# Altium footprint library En.PcbLib: 240 footprints (part 3 of 15)
Each footprint in its own frame and in the unit in brackets; x right, y up, seen from the top. Pads: shape width x height; smd on the part's side, far side on the other; paste and mask are expansions set on the pad; w line width, h text height; cw(c..) or ccw(c..) is an arc to the next point about the centre after c.
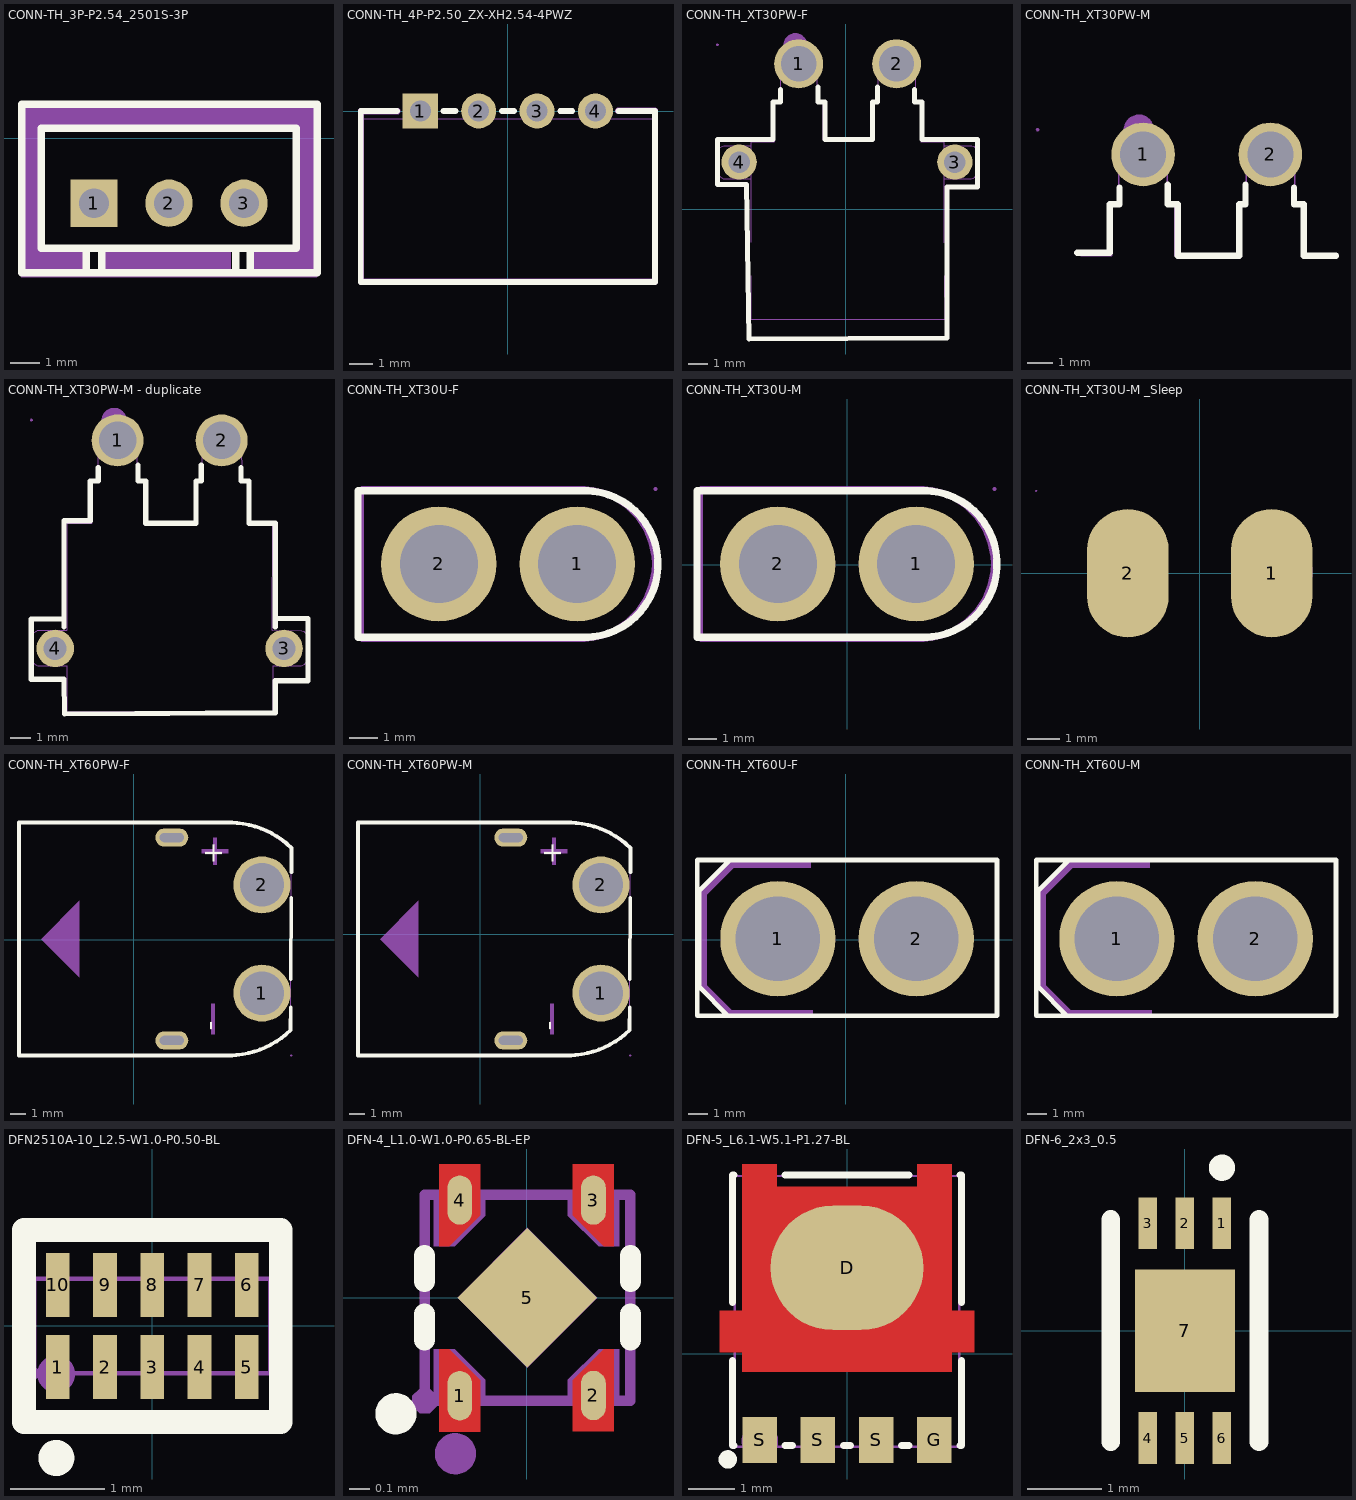
[diagram p2: the footprints below, top view; thin cyan lines are the x and y axes]

## CONN-TH_3P-P2.54_2501S-3P [mm]
pads (3):
  rect 1.6x1.6 hole 1: 1(37.211,-2.199)
  round 1.6 hole 1: 2(39.751,-2.199) 3(42.291,-2.199)
Top Overlay:
  lines w0.254: 36.957,-4.549 36.957,-3.723 ; 37.472,-4.549 37.472,-3.723 ; 42.019,-4.549 42.019,-3.723 ; 42.502,-4.549 42.502,-3.723 ; 34.771,-4.549 44.771,-4.549 44.771,1.151 34.771,1.151 34.771,-4.549 ; 35.433,-3.723 35.433,0.341 44.069,0.341 44.069,-3.723 35.433,-3.723
Mechanical 6:
  region: 42.545,-4.485 42.545,-3.723 44.069,-3.723 44.069,0.341 35.433,0.341 35.433,-3.723 36.957,-3.723 36.957,-4.485 34.671,-4.485 34.671,1.103 44.831,1.103 44.831,-4.485
  region: 37.531,-4.499 41.849,-4.499 41.849,-3.737 37.531,-3.737
Mechanical 15:
  region: 34.811,1.201 34.81,1.225 34.776,1.26 34.727,1.26 34.692,1.225 34.691,1.201 34.692,1.176 34.727,1.142 34.776,1.142 34.81,1.176
  region: 36.886,-1.874 37.536,-1.874 37.536,-2.524 36.886,-2.524
  region: 39.426,-1.874 40.076,-1.874 40.076,-2.524 39.426,-2.524
  region: 41.966,-1.874 42.616,-1.874 42.616,-2.524 41.966,-2.524
  lines w0.051: 34.751,-4.699 44.751,-4.699 44.751,1.201 34.751,1.201 34.751,-4.699
3D body "User Library-XH2_54-3P.sldprt": height 7, standoff -1.8, extent 34.898,-4.813 44.858,0.987

## CONN-TH_4P-P2.50_ZX-XH2.54-4PWZ [mm]
pads (4):
  rect 1.524x1.5 hole 0.9 paste-2539.97 mask+0.05: 1(-3.75,0)
  round 1.5 hole 0.9 paste-2539.97 mask+0.05: 2(-1.25,0) 3(1.25,0) 4(3.75,0)
Top Overlay:
  lines w0.254: -4.743,0 -6.303,0 -6.303,-7.32 6.303,-7.32 ; -2.757,0 -2.243,0 ; -0.257,0 0.257,0 ; 2.243,0 2.757,0 ; 4.743,0 6.303,0 6.303,-7.239
Mechanical 6:
  region: -4.735,-0.127 -6.168,-0.127 -6.168,-7.188 6.178,-7.188 6.178,-0.122 4.735,-0.122 4.682,-0.122 4.608,-0.048 4.608,0.058 4.682,0.132 4.735,0.132 6.305,0.132 6.33,0.132 6.377,0.113 6.413,0.077 6.432,0.03 6.432,0.005 6.432,-7.315 6.432,-7.34 6.413,-7.387 6.377,-7.423 6.33,-7.442 6.305,-7.442 -6.295,-7.442 -6.32,-7.442 -6.367,-7.423 -6.403,-7.387 -6.422,-7.34 -6.422,-7.315 -6.422,0 -6.422,0.025 -6.403,0.072 -6.367,0.108 -6.32,0.127 -6.295,0.127 -4.735,0.127 -4.682,0.127 -4.608,0.053 -4.608,-0.053 -4.682,-0.127
Mechanical 15:
  region: -4.07,-0.32 -4.07,-0.31 -3.435,-0.31 -3.43,-0.305 -3.43,-0.33 -4.07,-0.33
  region: -1.57,-0.32 -1.57,-0.31 -0.935,-0.31 -0.93,-0.305 -0.93,-0.33 -1.57,-0.33
  region: 0.93,-0.32 0.93,-0.31 1.565,-0.31 1.57,-0.305 1.57,-0.33 0.93,-0.33
  region: 3.43,-0.32 3.43,-0.31 4.065,-0.31 4.07,-0.305 4.07,-0.33 3.43,-0.33
  region: 3.43,0.32 4.07,0.32 4.07,-0.32 3.43,-0.32
  region: 0.93,0.32 1.57,0.32 1.57,-0.32 0.93,-0.32
  region: -1.57,0.32 -0.93,0.32 -0.93,-0.32 -1.57,-0.32
  region: -4.07,0.32 -3.43,0.32 -3.43,-0.32 -4.07,-0.32
  region: -6.19,-7.32 -6.191,-7.296 -6.226,-7.262 -6.274,-7.262 -6.309,-7.296 -6.31,-7.32 -6.309,-7.344 -6.274,-7.378 -6.226,-7.378 -6.191,-7.344
  lines w0.051: -6.25,-7.32 6.25,-7.32 6.25,-0.32 -6.25,-0.32 -6.25,-7.32
3D body "zx-xh2.54-4pwz.step": height 5.92, standoff -3.38, extent -6.25,-7.249 6.26,0.391

## CONN-TH_XT30PW-F [mm]
pads (4):
  round 2.5 hole 1.8: 1(-2.394,7.435) 2(2.606,7.435)
  round 1.8 hole 1.1: 3(5.588,2.413) 4(-5.436,2.413)
Top Overlay:
  lines w0.254: -3.323,6.118 -3.323,5.483 -3.704,5.483 -3.704,3.556 -4.974,3.556 -6.544,3.556 -6.544,1.27 -5.071,1.27 -4.927,-6.629 5.186,-6.571 5.186,1.143 6.756,1.143 6.756,3.556 5.186,3.556 3.916,3.556 3.916,5.483 3.535,5.483 3.535,6.118 ; -1.418,6.245 -1.418,5.483 -1.037,5.483 -1.037,3.556 1.376,3.556 1.376,5.483 1.63,5.483 1.63,6.245
Mechanical 6:
  circle w0.6: c-2.561,8.404 r0.3
Mechanical 15:
  drawing of 94 lines, arcs and shapes, not listed
3D body "User Library-XT30PW-F.sldprt": height 5, standoff -2, extent -6.523,-6.499 6.777,8.401

## CONN-TH_XT30PW-M [mm]
pads (2):
  round 2.5 hole 1.8: 1(42.945,-26.347) 2(47.945,-26.347)
Top Overlay:
  lines w0.254: 40.365,-30.204 41.635,-30.204 41.635,-28.299 42.016,-28.299 42.016,-27.664 ; 43.921,-27.537 43.921,-28.299 44.302,-28.299 44.302,-30.331 46.715,-30.331 46.715,-28.299 46.969,-28.299 46.969,-27.537 ; 48.874,-27.664 48.874,-28.299 49.255,-28.299 49.255,-30.331 50.525,-30.331
Mechanical 6:
  circle w0.6: c42.778,-25.378 r0.3
Mechanical 15:
  region: 48.595,-26.347 48.595,-26.262 48.551,-26.096 48.465,-25.948 48.344,-25.827 48.196,-25.742 48.031,-25.697 47.859,-25.697 47.694,-25.742 47.546,-25.827 47.425,-25.948 47.339,-26.096 47.295,-26.262 47.295,-26.347 47.295,-26.433 47.339,-26.598 47.425,-26.747 47.546,-26.868 47.694,-26.953 47.859,-26.998 48.031,-26.998 48.196,-26.953 48.344,-26.868 48.465,-26.747 48.551,-26.598 48.595,-26.433
  region: 43.595,-26.347 43.595,-26.262 43.551,-26.096 43.465,-25.948 43.344,-25.827 43.196,-25.742 43.031,-25.697 42.859,-25.697 42.694,-25.742 42.546,-25.827 42.425,-25.948 42.339,-26.096 42.295,-26.262 42.295,-26.347 42.295,-26.433 42.339,-26.598 42.425,-26.747 42.546,-26.868 42.694,-26.953 42.859,-26.998 43.031,-26.998 43.196,-26.953 43.344,-26.868 43.465,-26.747 43.551,-26.598 43.595,-26.433
  region: 38.855,-25.376 38.855,-25.351 38.82,-25.316 38.77,-25.316 38.735,-25.351 38.735,-25.376 38.735,-25.401 38.77,-25.436 38.82,-25.436 38.855,-25.401
  lines w0.051: 40.49,-30.323 41.704,-30.327 41.697,-28.328 41.994,-28.33 41.994,-26.255 42.025,-26.095 42.073,-25.95 42.094,-25.912 42.094,-25.911 42.14,-25.804 42.258,-25.682 42.361,-25.574 42.498,-25.489 42.635,-25.428 42.78,-25.384 42.956,-25.377 43.097,-25.388 43.25,-25.428 43.398,-25.491 43.531,-25.579 43.642,-25.687 43.75,-25.813 43.818,-25.956 43.865,-26.101 43.897,-26.25 43.895,-28.328 44.196,-28.328 44.195,-30.33 46.701,-30.327 46.696,-28.329 46.998,-28.325 46.993,-26.256 47.025,-26.093 47.076,-25.942 47.147,-25.804 47.244,-25.688 47.366,-25.576 47.497,-25.488 47.627,-25.429 47.783,-25.387 47.934,-25.376 48.105,-25.386 48.26,-25.431 48.392,-25.486 48.522,-25.578 48.651,-25.691 48.745,-25.807 48.812,-25.944 48.864,-26.09 48.897,-26.243 48.904,-28.325 49.185,-28.329 49.197,-30.33 50.395,-30.325

## CONN-TH_XT30PW-M - duplicate [mm]
pads (4):
  round 2.5 hole 1.8: 1(42.945,-26.347) 2(47.945,-26.347)
  round 1.8 hole 1.1: 3(50.945,-36.347) 4(39.945,-36.347)
Top Overlay:
  lines w0.254: 40.365,-35.297 40.365,-31.3 40.365,-30.204 41.635,-30.204 41.635,-28.299 42.016,-28.299 42.016,-27.664 ; 40.365,-34.932 38.795,-34.932 38.795,-37.828 40.365,-37.828 40.395,-39.497 50.525,-39.439 50.525,-37.897 ; 43.921,-27.537 43.921,-28.299 44.302,-28.299 44.302,-30.331 46.715,-30.331 46.715,-28.299 46.969,-28.299 46.969,-27.537 ; 48.874,-27.664 48.874,-28.299 49.255,-28.299 49.255,-30.331 50.525,-30.331 50.525,-31.3 50.525,-35.297 ; 50.525,-37.898 52.095,-37.898 52.095,-34.907 50.525,-34.907
Mechanical 6:
  circle w0.6: c42.778,-25.378 r0.3
Mechanical 15:
  drawing of 94 lines, arcs and shapes, not listed
3D body "User Library-XT30PW-M.sldprt": height 5, standoff -2, extent 38.77,-39.483 52.07,-25.541

## CONN-TH_XT30U-F [mm]
pads (2):
  round 4 hole 2.7: 1(44.818,-8.984) 2(40.018,-8.984)
Top Overlay:
  lines w0.254: 45.085,-11.524 ccw(c45.085,-8.984) 45.085,-6.444 ; 45.212,-11.524 37.211,-11.524 37.211,-6.444 45.212,-6.444
Mechanical 6:
  region: 47.418,-8.984 47.406,-8.739 47.31,-8.258 47.123,-7.805 46.85,-7.398 46.504,-7.051 46.096,-6.779 45.644,-6.592 45.163,-6.496 44.918,-6.484 44.918,-6.284 45.095,-6.284 45.446,-6.33 45.788,-6.422 46.115,-6.557 46.421,-6.734 46.702,-6.95 46.952,-7.2 47.168,-7.481 47.345,-7.787 47.48,-8.114 47.572,-8.456 47.618,-8.807 47.618,-8.984
  region: 44.918,-11.484 45.163,-11.472 45.644,-11.376 46.096,-11.189 46.504,-10.917 46.85,-10.57 47.123,-10.162 47.31,-9.71 47.406,-9.229 47.418,-8.984 47.618,-8.984 47.618,-9.161 47.572,-9.512 47.48,-9.854 47.345,-10.181 47.168,-10.487 46.952,-10.768 46.702,-11.018 46.421,-11.234 46.115,-11.411 45.788,-11.546 45.446,-11.638 45.095,-11.684 44.918,-11.684
  region: 44.918,-6.284 37.318,-6.284 37.218,-6.384 37.218,-11.584 37.318,-11.684 44.918,-11.684 44.918,-11.484 37.418,-11.484 37.418,-6.484 44.918,-6.484
Mechanical 15:
  region: 45.918,-8.984 45.918,-8.852 45.85,-8.598 45.718,-8.37 45.532,-8.184 45.304,-8.052 45.05,-7.984 44.786,-7.984 44.532,-8.052 44.304,-8.184 44.118,-8.37 43.986,-8.598 43.918,-8.852 43.918,-8.984 43.918,-9.116 43.986,-9.37 44.118,-9.598 44.304,-9.784 44.532,-9.916 44.786,-9.984 45.05,-9.984 45.304,-9.916 45.532,-9.784 45.718,-9.598 45.85,-9.37 45.918,-9.116
  region: 40.918,-8.984 40.918,-8.852 40.85,-8.598 40.718,-8.37 40.532,-8.184 40.304,-8.052 40.05,-7.984 39.786,-7.984 39.532,-8.052 39.304,-8.184 39.118,-8.37 38.986,-8.598 38.918,-8.852 38.918,-8.984 38.918,-9.116 38.986,-9.37 39.118,-9.598 39.304,-9.784 39.532,-9.916 39.786,-9.984 40.05,-9.984 40.304,-9.916 40.532,-9.784 40.718,-9.598 40.85,-9.37 40.918,-9.116
  region: 47.592,-6.384 47.592,-6.359 47.557,-6.324 47.507,-6.324 47.472,-6.359 47.472,-6.384 47.472,-6.409 47.507,-6.444 47.557,-6.444 47.592,-6.409
  lines w0.051: 37.318,-11.584 44.932,-11.584 ccw(c44.932,-8.984) 47.532,-8.984 ccw(c44.932,-8.984) 44.932,-6.384 37.338,-6.444 ccw(c37.338,-6.464) 37.318,-6.464 37.318,-11.584
3D body "User Library-xt30-f.sldprt": height 9.4, standoff -3, extent 37.191,-11.55 47.391,-6.35

## CONN-TH_XT30U-M [mm]
pads (2):
  round 4 hole 2.7: 1(2.4,0.033) 2(-2.4,0.033)
Top Overlay:
  lines w0.254: 2.667,-2.507 ccw(c2.667,0.033) 2.667,2.573 ; 2.794,-2.507 -5.207,-2.507 -5.207,2.573 2.794,2.573
Mechanical 6:
  region: 2.5,2.733 -5.1,2.733 -5.2,2.633 -5.2,-2.567 -5.1,-2.667 2.5,-2.667 2.5,-2.467 -5,-2.467 -5,2.533 2.5,2.533
  region: 2.5,-2.467 2.745,-2.455 3.226,-2.359 3.678,-2.172 4.086,-1.9 4.432,-1.553 4.705,-1.145 4.892,-0.693 4.988,-0.212 5,0.033 5.2,0.033 5.2,-0.144 5.154,-0.495 5.062,-0.837 4.927,-1.164 4.75,-1.47 4.534,-1.751 4.284,-2.001 4.003,-2.217 3.697,-2.394 3.37,-2.529 3.028,-2.621 2.677,-2.667 2.5,-2.667
  region: 5,0.033 4.988,0.278 4.892,0.759 4.705,1.212 4.432,1.619 4.086,1.966 3.678,2.238 3.226,2.425 2.745,2.521 2.5,2.533 2.5,2.733 2.677,2.733 3.028,2.687 3.37,2.595 3.697,2.46 4.003,2.283 4.284,2.067 4.534,1.817 4.75,1.536 4.927,1.23 5.062,0.903 5.154,0.561 5.2,0.21 5.2,0.033
Mechanical 15:
  region: 5.174,2.633 5.174,2.658 5.139,2.693 5.089,2.693 5.054,2.658 5.054,2.633 5.054,2.608 5.089,2.573 5.139,2.573 5.174,2.608
  region: -1.5,0.033 -1.5,0.165 -1.568,0.419 -1.7,0.647 -1.886,0.833 -2.114,0.965 -2.368,1.033 -2.632,1.033 -2.886,0.965 -3.114,0.833 -3.3,0.647 -3.432,0.419 -3.5,0.165 -3.5,0.033 -3.5,-0.099 -3.432,-0.353 -3.3,-0.581 -3.114,-0.767 -2.886,-0.899 -2.632,-0.967 -2.368,-0.967 -2.114,-0.899 -1.886,-0.767 -1.7,-0.581 -1.568,-0.353 -1.5,-0.099
  region: 3.5,0.033 3.5,0.165 3.432,0.419 3.3,0.647 3.114,0.833 2.886,0.965 2.632,1.033 2.368,1.033 2.114,0.965 1.886,0.833 1.7,0.647 1.568,0.419 1.5,0.165 1.5,0.033 1.5,-0.099 1.568,-0.353 1.7,-0.581 1.886,-0.767 2.114,-0.899 2.368,-0.967 2.632,-0.967 2.886,-0.899 3.114,-0.767 3.3,-0.581 3.432,-0.353 3.5,-0.099
  lines w0.051: -5.1,-2.567 -5.1,2.553 cw(c-5.08,2.553) -5.08,2.573 2.514,2.633 cw(c2.514,0.033) 5.114,0.033 cw(c2.514,0.033) 2.514,-2.567 -5.1,-2.567
3D body "User Library-xt30upb-m_XT30UPB-M-PIN.sldprt": height 7.81, standoff -2.59, extent 1.176,-1.217 3.676,1.283
3D body "User Library-xt30upb-m_XT30UPB-M-PIN.sldprt": height 7.81, standoff -2.59, extent -3.65,-1.217 -1.15,1.283
3D body "User Library-xt30upb-m_XT30UPB-M.sldprt": height 9.41, standoff 0.01, extent -5.12,-2.473 5.08,2.727

## CONN-TH_XT30U-M _Sleep [mm]
pads (2):
  oval 2.54x4 smd: 1(2.241,0) 2(-2.241,0)
Mechanical 15:
  region: 3.5,0.033 3.5,0.165 3.432,0.419 3.3,0.647 3.114,0.833 2.886,0.965 2.632,1.033 2.368,1.033 2.114,0.965 1.886,0.833 1.7,0.647 1.568,0.419 1.5,0.165 1.5,0.033 1.5,-0.099 1.568,-0.353 1.7,-0.581 1.886,-0.767 2.114,-0.899 2.368,-0.967 2.632,-0.967 2.886,-0.899 3.114,-0.767 3.3,-0.581 3.432,-0.353 3.5,-0.099
  region: -1.5,0.033 -1.5,0.165 -1.568,0.419 -1.7,0.647 -1.886,0.833 -2.114,0.965 -2.368,1.033 -2.632,1.033 -2.886,0.965 -3.114,0.833 -3.3,0.647 -3.432,0.419 -3.5,0.165 -3.5,0.033 -3.5,-0.099 -3.432,-0.353 -3.3,-0.581 -3.114,-0.767 -2.886,-0.899 -2.632,-0.967 -2.368,-0.967 -2.114,-0.899 -1.886,-0.767 -1.7,-0.581 -1.568,-0.353 -1.5,-0.099
  lines w0.051: -5.1,2.553 cw(c-5.08,2.553) -5.08,2.573
3D body "xt30u-m.step": height 3.85, standoff -1.36, extent -5.1,-13.494 5.1,0.206

## CONN-TH_XT60PW-F [mm]
pads (4):
  round 3.8 hole 2.9 paste-2539.97 mask+0.05: 1(8.545,-3.54) 2(8.545,3.66)
  oval 2.2x1.2 hole 0.6 slot 1.6 at 0 deg paste-2539.97 mask+0.05: ""(2.546,-6.69) ""(2.546,6.81)
Top Overlay:
  lines w0.254: 6.434,-7.687 ccw(c6.292,-1.689) 10.462,-6.002 ; 6.482,7.807 cw(c6.34,1.809) 10.51,6.122 10.502,4.501 ; 6.545,-7.69 -7.62,-7.69 -7.62,7.81 6.545,7.81 ; 10.447,-5.934 10.455,-4.484 ; 10.465,-2.616 10.493,2.798
  text "-" at 5.655,-6.036 h1.33
  text "+" at 5.909,5.013 h1.33
Mechanical 6:
  region: -3.599,2.6 -3.599,-2.48 -6.139,0.06
  region: 5.292,6.791 5.546,6.791 5.546,6.029 6.308,6.029 6.308,5.775 5.546,5.775 5.546,5.013 5.292,5.013 5.292,5.775 4.53,5.775 4.53,6.029 5.292,6.029
  region: 5.165,-4.258 5.419,-4.258 5.419,-6.29 5.165,-6.29
Mechanical 15:
  region: 10.558,-7.687 10.557,-7.663 10.523,-7.63 10.474,-7.63 10.44,-7.663 10.439,-7.687 10.44,-7.711 10.474,-7.745 10.523,-7.745 10.557,-7.711
  region: 3.146,-6.49 3.146,-6.89 1.946,-6.89 1.946,-6.49
  region: 9.546,-3.54 9.546,-3.408 9.477,-3.154 9.346,-2.926 9.16,-2.74 8.932,-2.608 8.677,-2.54 8.414,-2.54 8.159,-2.608 7.931,-2.74 7.745,-2.926 7.613,-3.154 7.545,-3.408 7.545,-3.54 7.545,-3.672 7.613,-3.926 7.745,-4.154 7.931,-4.34 8.159,-4.472 8.414,-4.54 8.677,-4.54 8.932,-4.472 9.16,-4.34 9.346,-4.154 9.477,-3.926 9.546,-3.672
  region: 9.546,3.66 9.546,3.792 9.477,4.046 9.346,4.274 9.16,4.46 8.932,4.592 8.677,4.66 8.414,4.66 8.159,4.592 7.931,4.46 7.745,4.274 7.613,4.046 7.545,3.792 7.545,3.66 7.545,3.528 7.613,3.274 7.745,3.046 7.931,2.86 8.159,2.728 8.414,2.66 8.677,2.66 8.932,2.728 9.16,2.86 9.346,3.046 9.477,3.274 9.546,3.528
  region: 3.146,7.01 3.146,6.61 1.946,6.61 1.946,7.01
  lines w0.051: -7.62,-7.687 6.688,-7.687 7.704,-7.433 8.72,-7.179 9.482,-6.798 10.244,-6.163 10.447,-5.934 10.498,6.029 10.371,6.156 9.355,6.918 8.339,7.426 7.323,7.68 6.561,7.807 -7.62,7.807 -7.62,-7.687
3D body "User Library-XT60PW-F.sldprt": height 8.4, standoff -2.5, extent -6.822,-7.69 10.378,7.81

## CONN-TH_XT60PW-M [mm]
pads (4):
  round 3.8 hole 2.9 paste-2539.97 mask+0.05: 1(8.037,-3.921) 2(8.037,3.279)
  oval 2.2x1.2 hole 0.6 slot 1.6 at 0 deg paste-2539.97 mask+0.05: ""(2.038,-7.071) ""(2.038,6.429)
Top Overlay:
  lines w0.254: 5.926,-8.068 ccw(c5.784,-2.07) 9.954,-6.383 ; 5.974,7.426 cw(c5.832,1.428) 10.002,5.741 9.994,4.12 ; 6.037,-8.071 -8.128,-8.071 -8.128,7.429 6.037,7.429 ; 9.939,-6.315 9.947,-4.865 ; 9.957,-2.997 9.985,2.417
  text "-" at 5.147,-6.417 h1.33
  text "+" at 5.401,4.632 h1.33
Mechanical 6:
  region: -4.107,2.219 -4.107,-2.861 -6.647,-0.321
  region: 4.784,6.41 5.038,6.41 5.038,5.648 5.8,5.648 5.8,5.394 5.038,5.394 5.038,4.632 4.784,4.632 4.784,5.394 4.022,5.394 4.022,5.648 4.784,5.648
  region: 4.657,-4.639 4.911,-4.639 4.911,-6.671 4.657,-6.671
Mechanical 15:
  region: 10.05,-8.068 10.049,-8.044 10.015,-8.011 9.966,-8.011 9.932,-8.044 9.931,-8.068 9.932,-8.092 9.966,-8.126 10.015,-8.126 10.049,-8.092
  region: 9.038,3.279 9.038,3.411 8.969,3.665 8.838,3.893 8.652,4.079 8.424,4.211 8.169,4.279 7.906,4.279 7.651,4.211 7.423,4.079 7.237,3.893 7.105,3.665 7.037,3.411 7.037,3.279 7.037,3.147 7.105,2.893 7.237,2.665 7.423,2.479 7.651,2.347 7.906,2.279 8.169,2.279 8.424,2.347 8.652,2.479 8.838,2.665 8.969,2.893 9.038,3.147
  region: 9.038,-3.921 9.038,-3.789 8.969,-3.535 8.838,-3.307 8.652,-3.121 8.424,-2.989 8.169,-2.921 7.906,-2.921 7.651,-2.989 7.423,-3.121 7.237,-3.307 7.105,-3.535 7.037,-3.789 7.037,-3.921 7.037,-4.053 7.105,-4.307 7.237,-4.535 7.423,-4.721 7.651,-4.853 7.906,-4.921 8.169,-4.921 8.424,-4.853 8.652,-4.721 8.838,-4.535 8.969,-4.307 9.038,-4.053
  region: 2.638,6.629 2.638,6.229 1.438,6.229 1.438,6.629
  region: 2.638,-6.871 2.638,-7.271 1.438,-7.271 1.438,-6.871
  lines w0.051: -8.128,-8.068 6.18,-8.068 7.196,-7.814 8.212,-7.56 8.974,-7.179 9.736,-6.544 9.939,-6.315 9.99,5.648 9.863,5.775 8.847,6.537 7.831,7.045 6.815,7.299 6.053,7.426 -8.128,7.426 -8.128,-8.068
3D body "xt60pw-m.step": height 8.13, standoff -2.97, extent -8.112,-8.071 9.988,7.429

## CONN-TH_XT60U-F [mm]
pads (2):
  round 6 hole 4.4 paste-2539.97 mask+0.05: 1(-3.537,0.046) 2(3.663,0.046)
Top Overlay:
  lines w0.254: -5.936,-3.954 -7.737,-3.954 -7.737,4.146 -6.038,4.146 ; -5.238,4.146 7.863,4.146 7.863,-3.955 -6.137,-3.955 -7.636,-2.453 -7.636,2.545 -6.038,4.146 ; -5.136,4.146 -6.038,4.146
Mechanical 6:
  region: -1.837,4.146 -6.037,4.146 -7.637,2.546 -7.637,-2.454 -6.137,-3.954 -1.737,-3.954 -1.737,-3.654 -5.937,-3.654 -7.237,-2.354 -7.237,2.346 -5.837,3.746 -1.837,3.746
Mechanical 15:
  region: 5.413,0.046 5.413,0.218 5.346,0.556 5.214,0.875 5.022,1.162 4.779,1.405 4.492,1.597 4.173,1.729 3.835,1.796 3.491,1.796 3.152,1.729 2.834,1.597 2.547,1.405 2.304,1.162 2.112,0.875 1.98,0.556 1.913,0.218 1.913,0.046 1.913,-0.126 1.98,-0.464 2.112,-0.783 2.304,-1.07 2.547,-1.313 2.834,-1.505 3.152,-1.637 3.491,-1.704 3.835,-1.704 4.173,-1.637 4.492,-1.505 4.779,-1.313 5.022,-1.07 5.214,-0.783 5.346,-0.464 5.413,-0.126
  region: -1.787,0.046 -1.787,0.218 -1.854,0.556 -1.986,0.875 -2.178,1.162 -2.421,1.405 -2.708,1.597 -3.026,1.729 -3.365,1.796 -3.709,1.796 -4.047,1.729 -4.366,1.597 -4.653,1.405 -4.896,1.162 -5.088,0.875 -5.22,0.556 -5.287,0.218 -5.287,0.046 -5.287,-0.126 -5.22,-0.464 -5.088,-0.783 -4.896,-1.07 -4.653,-1.313 -4.366,-1.505 -4.047,-1.637 -3.709,-1.704 -3.365,-1.704 -3.026,-1.637 -2.708,-1.505 -2.421,-1.313 -2.178,-1.07 -1.986,-0.783 -1.854,-0.464 -1.787,-0.126
  region: -7.627,-4.004 -7.627,-3.979 -7.662,-3.944 -7.712,-3.944 -7.747,-3.979 -7.747,-4.004 -7.747,-4.029 -7.712,-4.064 -7.662,-4.064 -7.627,-4.029
  lines w0.051: -7.687,-4.004 7.813,-4.004 7.813,4.096 -7.687,4.096 -7.687,-4.004
3D body "User Library-XT60.sldprt": height 5.38, standoff -16.62, extent -7.967,-3.937 7.967,4.191

## CONN-TH_XT60U-M [mm]
pads (2):
  round 6 hole 4.4 paste-2539.97 mask+0.05: 1(39.897,-29.037) 2(47.097,-29.037)
Top Overlay:
  lines w0.254: 37.498,-33.037 35.697,-33.037 35.697,-24.937 37.396,-24.937 ; 38.196,-24.937 51.297,-24.937 51.297,-33.038 37.297,-33.038 35.798,-31.536 35.798,-26.538 37.396,-24.937 ; 38.298,-24.937 37.396,-24.937
Mechanical 6:
  region: 41.597,-24.937 37.397,-24.937 35.797,-26.537 35.797,-31.537 37.297,-33.037 41.697,-33.037 41.697,-32.737 37.497,-32.737 36.197,-31.437 36.197,-26.737 37.597,-25.337 41.597,-25.337
Mechanical 15:
  region: 35.807,-33.087 35.807,-33.062 35.772,-33.027 35.722,-33.027 35.687,-33.062 35.687,-33.087 35.687,-33.112 35.722,-33.147 35.772,-33.147 35.807,-33.112
  region: 41.647,-29.037 41.647,-28.865 41.58,-28.527 41.448,-28.208 41.256,-27.921 41.013,-27.678 40.726,-27.486 40.408,-27.354 40.069,-27.287 39.725,-27.287 39.387,-27.354 39.068,-27.486 38.781,-27.678 38.538,-27.921 38.346,-28.208 38.214,-28.527 38.147,-28.865 38.147,-29.037 38.147,-29.209 38.214,-29.547 38.346,-29.866 38.538,-30.153 38.781,-30.396 39.068,-30.588 39.387,-30.72 39.725,-30.787 40.069,-30.787 40.408,-30.72 40.726,-30.588 41.013,-30.396 41.256,-30.153 41.448,-29.866 41.58,-29.547 41.647,-29.209
  region: 48.847,-29.037 48.847,-28.865 48.78,-28.527 48.648,-28.208 48.456,-27.921 48.213,-27.678 47.926,-27.486 47.607,-27.354 47.269,-27.287 46.925,-27.287 46.586,-27.354 46.268,-27.486 45.981,-27.678 45.738,-27.921 45.546,-28.208 45.414,-28.527 45.347,-28.865 45.347,-29.037 45.347,-29.209 45.414,-29.547 45.546,-29.866 45.738,-30.153 45.981,-30.396 46.268,-30.588 46.586,-30.72 46.925,-30.787 47.269,-30.787 47.607,-30.72 47.926,-30.588 48.213,-30.396 48.456,-30.153 48.648,-29.866 48.78,-29.547 48.847,-29.209
  lines w0.051: 35.747,-33.087 35.747,-24.987 51.247,-24.987 51.247,-33.087 35.747,-33.087
3D body "User Library-XT60UPB Fem Vert_60UPB-MTJ.sldprt": height 8.38, standoff -6.02, extent 37.747,-31.187 42.047,-26.887
3D body "User Library-XT60UPB Fem Vert_60UPB-MTJ.sldprt": height 8.38, standoff -6.02, extent 44.986,-31.187 49.286,-26.887
3D body "User Library-XT60UPB Fem Vert_XT60UPB-ME毈_-UL.sldprt": height 13.5, standoff 0, extent 35.89,-33.02 51.232,-25.12

## DFN2510A-10_L2.5-W1.0-P0.50-BL [mm]
pads (10):
  rect 0.25x0.68 smd: 1(-1,-0.435) 2(-0.5,-0.435) 3(0,-0.435) 4(0.5,-0.435) 5(1,-0.435) 6(1,0.435) 7(0.5,0.435) 8(0,0.435) 9(-0.5,0.435) 10(-1,0.435)
Top Overlay:
  circle w0.254: c-1.016,-1.397 r0.064
  lines w0.254: -1.36,-1.016 1.36,-1.016 1.36,1.016 -1.36,1.016 -1.36,-1.016
Mechanical 6:
  circle w0.2: c-1.016,-0.508 r0.1
Mechanical 15:
  region: -1.19,-0.5 -1.191,-0.476 -1.226,-0.442 -1.274,-0.442 -1.309,-0.476 -1.31,-0.5 -1.309,-0.525 -1.274,-0.559 -1.226,-0.559 -1.191,-0.525
  region: -1.1,-0.1 -0.9,-0.1 -0.9,-0.5 -1.1,-0.5
  region: -0.6,-0.1 -0.4,-0.1 -0.4,-0.5 -0.6,-0.5
  region: -0.1,-0.1 0.1,-0.1 0.1,-0.5 -0.1,-0.5
  region: 0.4,-0.1 0.6,-0.1 0.6,-0.5 0.4,-0.5
  region: 0.9,-0.1 1.1,-0.1 1.1,-0.5 0.9,-0.5
  region: 0.9,0.5 1.1,0.5 1.1,0.1 0.9,0.1
  region: 0.4,0.5 0.6,0.5 0.6,0.1 0.4,0.1
  region: -0.1,0.5 0.1,0.5 0.1,0.1 -0.1,0.1
  region: -0.6,0.5 -0.4,0.5 -0.4,0.1 -0.6,0.1
  region: -1.1,0.5 -0.9,0.5 -0.9,0.1 -1.1,0.1
  lines w0.051: -1.25,-0.5 -1.25,0.5 1.25,0.5 1.25,-0.5 -1.25,-0.5
3D body "ip4292cz10-tbr.115.step": height 0.49, standoff -0.02, extent -1.26,-0.56 1.26,0.56

## DFN-4_L1.0-W1.0-P0.65-BL-EP [mm]
pads (5):
  oval 0.12x0.24 smd: 1(-0.325,-0.475) 2(0.325,-0.474) 3(0.325,0.475) 4(-0.325,0.475)
  rect 0.48x0.48 smd rot 45: 5(0.004,0.001)
Top Layer:
  region: 0.425,-0.649 0.225,-0.649 0.225,-0.399 0.375,-0.249 0.425,-0.249
  region: -0.225,-0.4 -0.225,-0.65 -0.425,-0.65 -0.425,-0.25 -0.375,-0.25
  region: -0.425,0.651 -0.225,0.651 -0.225,0.401 -0.375,0.251 -0.425,0.251
  region: 0.425,0.651 0.425,0.251 0.375,0.251 0.225,0.401 0.225,0.651
Top Overlay:
  circle w0.1: c-0.635,-0.563 r0.05
  lines w0.102: -0.496,-0.205 -0.496,-0.078 ; -0.496,0.079 -0.496,0.206 ; 0.504,-0.205 0.504,-0.078 ; 0.504,0.079 0.504,0.206
Mechanical 6:
  circle w0.1: c-0.346,-0.757 r0.05
Mechanical 15:
  region: -0.435,-0.501 -0.436,-0.477 -0.471,-0.442 -0.52,-0.442 -0.555,-0.477 -0.555,-0.501 -0.555,-0.526 -0.52,-0.56 -0.471,-0.56 -0.436,-0.526
  region: 0.45,-0.499 0.2,-0.499 0.2,-0.399 0.35,-0.249 0.45,-0.249
  region: -0.45,-0.499 -0.2,-0.499 -0.2,-0.399 -0.35,-0.249 -0.45,-0.249
  region: 0.45,0.501 0.2,0.501 0.2,0.4 0.35,0.25 0.45,0.25
  region: -0.45,0.501 -0.2,0.501 -0.2,0.4 -0.35,0.25 -0.45,0.25
  region: -0.335,0.001 0.004,0.34 0.344,0.001 0.004,-0.339
  lines w0.051: -0.495,-0.499 0.505,-0.499 0.505,0.501 -0.495,0.501 -0.495,-0.499
3D body "sk6018cd4-33.step": height 0.51, standoff 0, extent -0.51,-0.51 0.51,0.51

## DFN-5_L6.1-W5.1-P1.27-BL [mm]
pads (5):
  oval 3.33x2.718 smd: D(0,1.875)
  rect 0.75x1 smd: G(1.905,-1.875) S(-1.905,-1.875) S(-0.635,-1.875) S(0.635,-1.875)
Top Layer:
  region: -2.28,-0.39 -2.28,0.035 -2.775,0.035 -2.775,0.94 -2.28,0.94 -2.28,4.14 -1.53,4.14 -1.53,3.64 1.53,3.64 1.53,4.14 2.28,4.14 2.28,0.94 2.775,0.94 2.775,0.035 2.28,0.035 2.28,-0.39
Top Overlay:
  circle w0.2: c-2.6,-2.3 r0.1
  lines w0.152: -2.5,-0.145 -2.5,-2 -2.46,-2 ; -2.5,1.12 -2.5,3.9 -2.46,3.9 ; -1.35,-2 -1.19,-2 ; -1.35,3.9 1.35,3.9 ; -0.08,-2 0.08,-2 ; 1.19,-2 1.35,-2 ; 2.46,-2 2.5,-2 2.5,-0.145 ; 2.46,3.9 2.5,3.9 2.5,1.12
Mechanical 6:
  circle w0.4: c-1.9,-1.9 r0.2
Mechanical 15:
  region: -1.7,3.977 -1.7,3.402 1.7,3.402 1.7,3.977 2.11,3.977 2.11,3.127 2,3.127 2,1.552 2,0.632 2.575,0.632 2.575,0.222 2,0.222 2,-0.248 -2,-0.248 -2,0.222 -2.575,0.222 -2.575,0.632 -2,0.632 -2,3.127 -2.11,3.127 -2.11,3.977
  region: 1.7,-1.598 2.11,-1.598 2.11,-2.173 1.7,-2.173
  region: 0.43,-1.598 0.84,-1.598 0.84,-2.173 0.43,-2.173
  region: -0.84,-1.598 -0.43,-1.598 -0.43,-2.173 -0.84,-2.173
  region: -2.11,-1.598 -1.7,-1.598 -1.7,-2.173 -2.11,-2.173
  region: -2.515,-2.173 -2.515,-2.148 -2.55,-2.113 -2.6,-2.113 -2.635,-2.148 -2.635,-2.173 -2.635,-2.198 -2.6,-2.233 -2.55,-2.233 -2.515,-2.198
  lines w0.051: -2.45,-2.023 2.45,-2.023 2.45,3.877 -2.45,3.877 -2.45,-2.023
3D body "ntmfs5c410nlt1g.step": height 1.05, standoff 0, extent -2.575,-2.186 2.575,3.964

## DFN-6_2x3_0.5 [mm]
pads (7):
  rect 0.25x0.7 smd: 1(0.498,1.45) 2(0,1.45) 3(-0.5,1.45) 4(-0.5,-1.45) 5(-0.001,-1.45) 6(0.5,-1.45)
  rect 1.35x1.65 smd: 7(0,0)
Top Overlay:
  circle w0.254: c0.5,2.2 r0.05
  lines w0.254: -1,-1.5 -1,1.5 ; 1,-1.5 1,1.5
Mechanical 4:
  circle w0.06: c1,1.5 r0.03
3D body "User Library-DFN-6.STEP": height 0.8, standoff 0, extent -1,-1.5 1,1.5